# Altium footprint library Package_BGA.PcbLib: 159 footprints (part 8 of 22)
Each footprint in its own frame and in the unit in brackets; x right, y up, seen from the top. Pads: shape width x height; smd on the part's side, far side on the other; paste and mask are expansions set on the pad; w line width, h text height; cw(c..) or ccw(c..) is an arc to the next point about the centre after c.
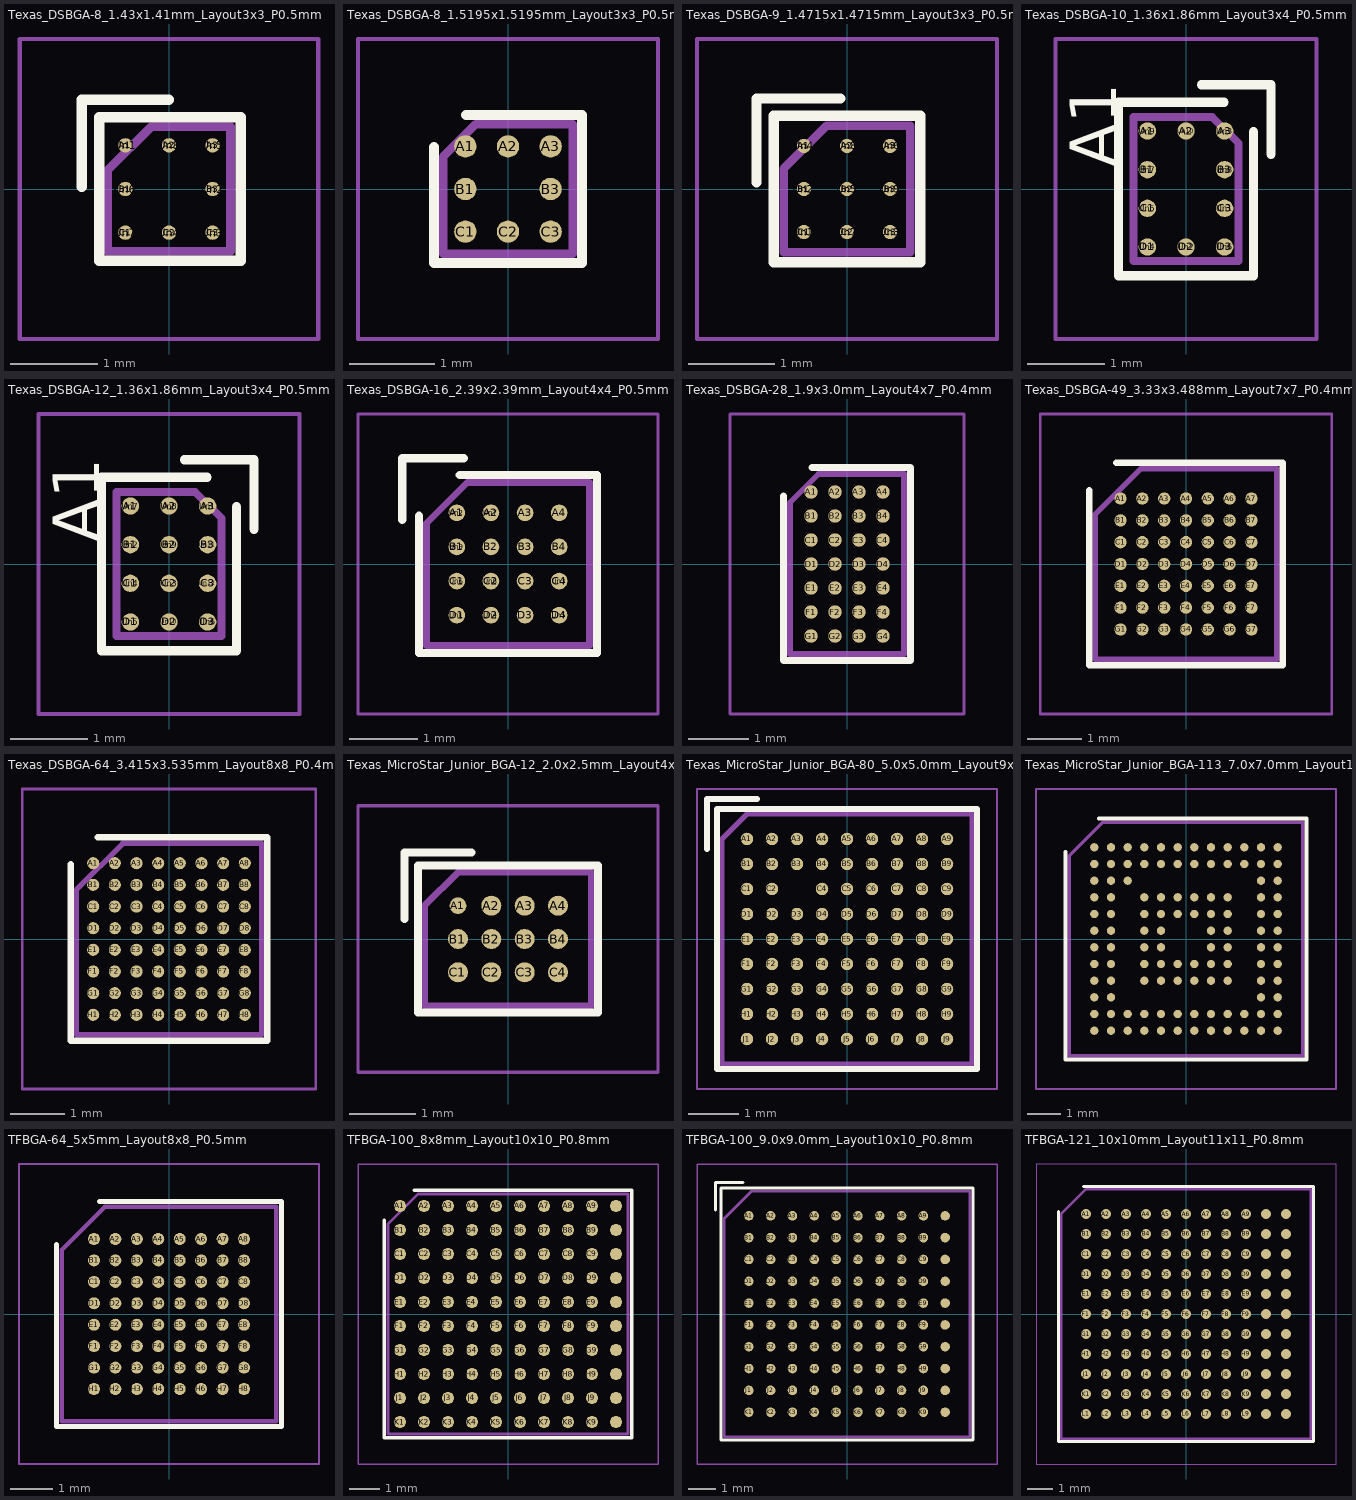
[diagram p7: the footprints below, top view; thin cyan lines are the x and y axes]

## Texas_DSBGA-8_1.43x1.41mm_Layout3x3_P0.5mm [mm]
pads (16):
  round 0.165 smd: A1(-0.5,0.5) A2(0,0.5) A3(0.5,0.5) B1(-0.5,0) B3(0.5,0) C1(-0.5,-0.5) C2(0,-0.5) C3(0.5,-0.5)
  rect 0.3x0.3 on Top Paste: Un1(-0.5,0.5) Un2(0.5,0) Un3(0.5,-0.5) Un4(0,-0.5) Un5(0.5,0.5) Un6(-0.5,0) Un7(-0.5,-0.5) Un8(0,0.5)
F.SilkS:
  lines w0.12: -1,0.025 -1,1.025 0,1.025 ; -0.8,-0.825 0.815,-0.825 ; -0.8,-0.8 -0.8,0.825 ; -0.775,0.825 0.815,0.825 ; 0.825,-0.825 0.825,0.825
F.CrtYd:
  lines w0.05: -1.71,-1.72 -1.71,1.72 1.71,1.72 1.71,-1.72 -1.71,-1.72
F.Fab:
  lines w0.1: -0.705,-0.715 0.705,-0.715 0.705,0.715 -0.205,0.715 -0.705,0.215 -0.705,-0.715
  text "'.Designator'" at -1.209,-0.247 h0.3

## Texas_DSBGA-8_1.5195x1.5195mm_Layout3x3_P0.5mm [mm]
pads (8):
  round 0.262 smd: A1(-0.5,0.5) A2(0,0.5) A3(0.5,0.5) B1(-0.5,0) B3(0.5,0) C1(-0.5,-0.5) C2(0,-0.5) C3(0.5,-0.5)
F.SilkS:
  lines w0.12: -0.87,0.49 -0.87,-0.87 0.87,-0.87 0.87,0.87 -0.49,0.87
F.CrtYd:
  lines w0.05: -1.76,-1.76 1.76,-1.76 1.76,1.76 -1.76,1.76 -1.76,-1.76
F.Fab:
  lines w0.1: -0.76,-0.76 0.76,-0.76 0.76,0.76 -0.38,0.76 -0.76,0.38 -0.76,-0.76
  text "'.Designator'" at -1.416,-0.294 h0.35

## Texas_DSBGA-9_1.4715x1.4715mm_Layout3x3_P0.5mm [mm]
pads (18):
  round 0.165 smd: A1(-0.5,0.5) A2(0,0.5) A3(0.5,0.5) B1(-0.5,0) B2(0,0) B3(0.5,0) C1(-0.5,-0.5) C2(0,-0.5) C3(0.5,-0.5)
  rect 0.3x0.3 on Top Paste: Un1(-0.5,-0.5) Un2(-0.5,0) Un3(0.5,-0.5) Un4(-0.5,0.5) Un5(0,0) Un6(0.5,0.5) Un7(0,-0.5) Un8(0,0.5) Un9(0.5,0)
F.SilkS:
  lines w0.12: -1.05,0.075 -1.05,1.05 -0.075,1.05 ; -0.85,-0.85 0.85,-0.85 0.85,0.85 -0.85,0.85 -0.85,-0.85
F.CrtYd:
  lines w0.05: -1.74,-1.74 -1.74,1.74 1.74,1.74 1.74,-1.74 -1.74,-1.74
F.Fab:
  lines w0.1: -0.736,-0.736 -0.736,0.236 -0.236,0.736 0.736,0.736 0.736,-0.736 -0.736,-0.736
  text "'.Designator'" at -1.209,-0.247 h0.3

## Texas_DSBGA-10_1.36x1.86mm_Layout3x4_P0.5mm [mm]
pads (20):
  round 0.225 smd: A1(-0.5,0.75) A2(0,0.75) A3(0.5,0.75) B1(-0.5,0.25) B3(0.5,0.25) C1(-0.5,-0.25) C3(0.5,-0.25) D1(-0.5,-0.75) D2(0,-0.75) D3(0.5,-0.75)
  rrect20% 0.25x0.25 on Top Paste: Un1(0.5,-0.25) Un2(0,-0.75) Un3(0.5,0.75) Un4(-0.5,-0.75) Un5(-0.5,-0.25) Un6(0.5,-0.75) Un7(-0.5,0.25) Un8(0.5,0.25) Un9(-0.5,0.75) Un10(0,0.75)
F.SilkS:
  lines w0.12: 0.2,1.35 1.1,1.35 1.1,0.45 ; 0.491,1.122 -0.873,1.122 -0.873,-1.122 0.873,-1.122 0.873,0.741
  text "A1" at -0.9,0.28 h0.6
F.CrtYd:
  lines w0.05: -1.69,-1.94 -1.69,1.94 1.69,1.94 1.69,-1.94 -1.69,-1.94
F.Fab:
  lines w0.1: -0.68,-0.93 0.68,-0.93 0.68,0.59 0.34,0.93 -0.68,0.93 -0.68,-0.93
  text "'.Designator'" at -0.361,1.74 h0.43

## Texas_DSBGA-12_1.36x1.86mm_Layout3x4_P0.5mm [mm]
pads (24):
  round 0.225 smd: A1(-0.5,0.75) A2(0,0.75) A3(0.5,0.75) B1(-0.5,0.25) B2(0,0.25) B3(0.5,0.25) C1(-0.5,-0.25) C2(0,-0.25) C3(0.5,-0.25) D1(-0.5,-0.75) D2(0,-0.75) D3(0.5,-0.75)
  rrect20% 0.25x0.25 on Top Paste: Un1(0.5,0.75) Un2(-0.5,0.25) Un3(0,-0.25) Un4(-0.5,-0.25) Un5(-0.5,-0.75) Un6(0.5,-0.75) Un7(-0.5,0.75) Un8(0,0.75) Un9(0,0.25) Un10(0,-0.75) Un11(0.5,0.25) Un12(0.5,-0.25)
F.SilkS:
  lines w0.12: 0.2,1.35 1.1,1.35 1.1,0.45 ; 0.491,1.122 -0.873,1.122 -0.873,-1.122 0.873,-1.122 0.873,0.741
  text "A1" at -0.9,0.28 h0.6
F.CrtYd:
  lines w0.05: -1.69,-1.94 -1.69,1.94 1.69,1.94 1.69,-1.94 -1.69,-1.94
F.Fab:
  lines w0.1: -0.68,-0.93 -0.68,0.93 0.34,0.93 0.68,0.59 0.68,-0.93 -0.68,-0.93
  text "'.Designator'" at -0.361,1.74 h0.43

## Texas_DSBGA-16_2.39x2.39mm_Layout4x4_P0.5mm [mm]
pads (32):
  round 0.245 smd: A1(-0.75,0.75) A2(-0.25,0.75) A3(0.25,0.75) A4(0.75,0.75) B1(-0.75,0.25) B2(-0.25,0.25) B3(0.25,0.25) B4(0.75,0.25) C1(-0.75,-0.25) C2(-0.25,-0.25) C3(0.25,-0.25) C4(0.75,-0.25) D1(-0.75,-0.75) D2(-0.25,-0.75) D3(0.25,-0.75) D4(0.75,-0.75)
  rrect20% 0.25x0.25 on Top Paste: Un1(-0.75,-0.75) Un2(-0.75,0.75) Un3(0.75,-0.25) Un4(-0.25,-0.75) Un5(0.75,-0.75) Un6(-0.75,-0.25) Un7(-0.25,0.75) Un8(-0.25,-0.25) Un9(-0.75,0.25) Un10(0.25,-0.75) Un11(0.75,0.25) Un12(-0.25,0.25) Un13(0.75,0.75) Un14(0.25,0.75) Un15(0.25,-0.25) Un16(0.25,0.25)
F.SilkS:
  lines w0.12: -1.55,0.65 -1.55,1.55 -0.65,1.55 ; -1.305,0.707 -1.305,-1.305 1.305,-1.305 1.305,1.305 -0.707,1.305
F.CrtYd:
  lines w0.05: -2.2,-2.2 -2.2,2.2 2.2,2.2 2.2,-2.2 -2.2,-2.2
F.Fab:
  lines w0.1: -1.195,-1.195 -1.195,0.597 -0.597,1.195 1.195,1.195 1.195,-1.195 -1.195,-1.195
  text "'.Designator'" at -2.266,-0.471 h0.56

## Texas_DSBGA-28_1.9x3.0mm_Layout4x7_P0.4mm [mm]
pads (28):
  round 0.225 smd: A1(-0.6,1.2) A2(-0.2,1.2) A3(0.2,1.2) A4(0.6,1.2) B1(-0.6,0.8) B2(-0.2,0.8) B3(0.2,0.8) B4(0.6,0.8) C1(-0.6,0.4) C2(-0.2,0.4) C3(0.2,0.4) C4(0.6,0.4) D1(-0.6,0) D2(-0.2,0) D3(0.2,0) D4(0.6,0) E1(-0.6,-0.4) E2(-0.2,-0.4) E3(0.2,-0.4) E4(0.6,-0.4) F1(-0.6,-0.8) F2(-0.2,-0.8) F3(0.2,-0.8) F4(0.6,-0.8) G1(-0.6,-1.2) G2(-0.2,-1.2) G3(0.2,-1.2) G4(0.6,-1.2)
F.SilkS:
  lines w0.12: -1.06,1.135 -1.06,-1.61 1.06,-1.61 1.06,1.61 -0.585,1.61
F.CrtYd:
  lines w0.05: -1.95,-2.5 1.95,-2.5 1.95,2.5 -1.95,2.5 -1.95,-2.5
F.Fab:
  lines w0.1: -0.95,-1.5 -0.95,1.025 -0.475,1.5 0.95,1.5 0.95,-1.5 -0.95,-1.5
  text "'.Designator'" at -1.781,-0.37 h0.44

## Texas_DSBGA-49_3.33x3.488mm_Layout7x7_P0.4mm [mm]
pads (49):
  round 0.225 smd: A1(-1.2,1.2) A2(-0.8,1.2) A3(-0.4,1.2) A4(0,1.2) A5(0.4,1.2) A6(0.8,1.2) A7(1.2,1.2) B1(-1.2,0.8) B2(-0.8,0.8) B3(-0.4,0.8) B4(0,0.8) B5(0.4,0.8) B6(0.8,0.8) B7(1.2,0.8) C1(-1.2,0.4) C2(-0.8,0.4) C3(-0.4,0.4) C4(0,0.4) C5(0.4,0.4) C6(0.8,0.4) C7(1.2,0.4) D1(-1.2,0) D2(-0.8,0) D3(-0.4,0) D4(0,0) D5(0.4,0) D6(0.8,0) D7(1.2,0) E1(-1.2,-0.4) E2(-0.8,-0.4) E3(-0.4,-0.4) E4(0,-0.4) E5(0.4,-0.4) E6(0.8,-0.4) E7(1.2,-0.4) F1(-1.2,-0.8) F2(-0.8,-0.8) F3(-0.4,-0.8) F4(0,-0.8) F5(0.4,-0.8) F6(0.8,-0.8) F7(1.2,-0.8) G1(-1.2,-1.2) G2(-0.8,-1.2) G3(-0.4,-1.2) G4(0,-1.2) G5(0.4,-1.2) G6(0.8,-1.2) G7(1.2,-1.2)
F.SilkS:
  lines w0.12: -1.775,1.354 -1.775,-1.854 1.775,-1.854 1.775,1.854 -1.275,1.854
F.CrtYd:
  lines w0.05: -2.67,-2.75 -2.67,2.75 2.67,2.75 2.67,-2.75 -2.67,-2.75
F.Fab:
  lines w0.1: -1.665,-1.744 1.665,-1.744 1.665,1.744 -0.833,1.744 -1.665,0.911 -1.665,-1.744
  text "'.Designator'" at -3.247,-0.682 h0.8

## Texas_DSBGA-64_3.415x3.535mm_Layout8x8_P0.4mm [mm]
pads (64):
  round 0.225 smd: A1(-1.4,1.4) A2(-1,1.4) A3(-0.6,1.4) A4(-0.2,1.4) A5(0.2,1.4) A6(0.6,1.4) A7(1,1.4) A8(1.4,1.4) B1(-1.4,1) B2(-1,1) B3(-0.6,1) B4(-0.2,1) B5(0.2,1) B6(0.6,1) B7(1,1) B8(1.4,1) C1(-1.4,0.6) C2(-1,0.6) C3(-0.6,0.6) C4(-0.2,0.6) C5(0.2,0.6) C6(0.6,0.6) C7(1,0.6) C8(1.4,0.6) D1(-1.4,0.2) D2(-1,0.2) D3(-0.6,0.2) D4(-0.2,0.2) D5(0.2,0.2) D6(0.6,0.2) D7(1,0.2) D8(1.4,0.2) E1(-1.4,-0.2) E2(-1,-0.2) E3(-0.6,-0.2) E4(-0.2,-0.2) E5(0.2,-0.2) E6(0.6,-0.2) E7(1,-0.2) E8(1.4,-0.2) F1(-1.4,-0.6) F2(-1,-0.6) F3(-0.6,-0.6) F4(-0.2,-0.6) F5(0.2,-0.6) F6(0.6,-0.6) F7(1,-0.6) F8(1.4,-0.6) G1(-1.4,-1) G2(-1,-1) G3(-0.6,-1) G4(-0.2,-1) G5(0.2,-1) G6(0.6,-1) G7(1,-1) G8(1.4,-1) H1(-1.4,-1.4) H2(-1,-1.4) H3(-0.6,-1.4) H4(-0.2,-1.4) H5(0.2,-1.4) H6(0.6,-1.4) H7(1,-1.4) H8(1.4,-1.4)
F.SilkS:
  lines w0.12: -1.817,1.378 -1.817,-1.877 1.817,-1.877 1.817,1.877 -1.318,1.877
F.CrtYd:
  lines w0.05: -2.71,-2.77 -2.71,2.77 2.71,2.77 2.71,-2.77 -2.71,-2.77
F.Fab:
  lines w0.1: -1.707,-1.767 -1.707,0.914 -0.854,1.767 1.707,1.767 1.707,-1.767 -1.707,-1.767
  text "'.Designator'" at -3.247,-0.682 h0.8

## Texas_MicroStar_Junior_BGA-12_2.0x2.5mm_Layout4x3_P0.5mm [mm]
pads (12):
  round 0.25 smd: A1(-0.75,0.5)
  round 0.3 smd: A2(-0.25,0.5) A3(0.25,0.5) A4(0.75,0.5) B1(-0.75,0) B2(-0.25,0) B3(0.25,0) B4(0.75,0) C1(-0.75,-0.5) C2(-0.25,-0.5) C3(0.25,-0.5) C4(0.75,-0.5)
F.SilkS:
  lines w0.12: -1.55,0.3 -1.55,1.3 -0.55,1.3 ; -1.35,-1.1 1.35,-1.1 1.35,1.1 -1.35,1.1 -1.35,-1.1
F.CrtYd:
  lines w0.05: -2.25,-2 2.25,-2 2.25,2 -2.25,2 -2.25,-2
F.Fab:
  lines w0.1: -1.25,-1 -1.25,0.5 -0.75,1 1.25,1 1.25,-1 -1.25,-1
  text "'.Designator'" at -2.398,-0.474 h0.6

## Texas_MicroStar_Junior_BGA-80_5.0x5.0mm_Layout9x9_P0.5mm [mm]
pads (80):
  round 0.25 smd: A1(-2,2) A2(-1.5,2) A3(-1,2) A4(-0.5,2) A5(0,2) A6(0.5,2) A7(1,2) A8(1.5,2) A9(2,2) B1(-2,1.5) B2(-1.5,1.5) B3(-1,1.5) B4(-0.5,1.5) B5(0,1.5) B6(0.5,1.5) B7(1,1.5) B8(1.5,1.5) B9(2,1.5) C1(-2,1) C2(-1.5,1) C4(-0.5,1) C5(0,1) C6(0.5,1) C7(1,1) C8(1.5,1) C9(2,1) D1(-2,0.5) D2(-1.5,0.5) D3(-1,0.5) D4(-0.5,0.5) D5(0,0.5) D6(0.5,0.5) D7(1,0.5) D8(1.5,0.5) D9(2,0.5) E1(-2,0) E2(-1.5,0) E3(-1,0) E4(-0.5,0) E5(0,0) E6(0.5,0) E7(1,0) E8(1.5,0) E9(2,0) F1(-2,-0.5) F2(-1.5,-0.5) F3(-1,-0.5) F4(-0.5,-0.5) F5(0,-0.5) F6(0.5,-0.5) F7(1,-0.5) F8(1.5,-0.5) F9(2,-0.5) G1(-2,-1) G2(-1.5,-1) G3(-1,-1) G4(-0.5,-1) G5(0,-1) G6(0.5,-1) G7(1,-1) G8(1.5,-1) G9(2,-1) H1(-2,-1.5) H2(-1.5,-1.5) H3(-1,-1.5) H4(-0.5,-1.5) H5(0,-1.5) H6(0.5,-1.5) H7(1,-1.5) H8(1.5,-1.5) H9(2,-1.5) J1(-2,-2) J2(-1.5,-2) J3(-1,-2) J4(-0.5,-2) J5(0,-2) J6(0.5,-2) J7(1,-2) J8(1.5,-2) J9(2,-2)
F.SilkS:
  lines w0.12: -2.8,1.8 -2.8,2.8 -1.8,2.8 ; -2.6,-2.6 2.6,-2.6 2.6,2.6 -2.6,2.6 -2.6,-2.6
F.CrtYd:
  lines w0.05: -3,-3 3,-3 3,3 -3,3 -3,-3
F.Fab:
  lines w0.1: -2.5,-2.5 2.5,-2.5 2.5,2.5 -2,2.5 -2.5,2 -2.5,-2.5
  text "'.Designator'" at -4.047,-0.84 h1

## Texas_MicroStar_Junior_BGA-113_7.0x7.0mm_Layout12x12_P0.5mm [mm]
pads (113):
  round 0.25 smd: A1(-2.75,2.75) A2(-2.25,2.75) A3(-1.75,2.75) A4(-1.25,2.75) A5(-0.75,2.75) A6(-0.25,2.75) A7(0.25,2.75) A8(0.75,2.75) A9(1.25,2.75) A10(1.75,2.75) A11(2.25,2.75) A12(2.75,2.75) B1(-2.75,2.25) B2(-2.25,2.25) B3(-1.75,2.25) B4(-1.25,2.25) B5(-0.75,2.25) B6(-0.25,2.25) B7(0.25,2.25) B8(0.75,2.25) B9(1.25,2.25) B10(1.75,2.25) B11(2.25,2.25) B12(2.75,2.25) C1(-2.75,1.75) C2(-2.25,1.75) C3(-1.75,1.75) C11(2.25,1.75) C12(2.75,1.75) D1(-2.75,1.25) D2(-2.25,1.25) D4(-1.25,1.25) D5(-0.75,1.25) D6(-0.25,1.25) D7(0.25,1.25) D8(0.75,1.25) D9(1.25,1.25) D11(2.25,1.25) D12(2.75,1.25) E1(-2.75,0.75) E2(-2.25,0.75) E4(-1.25,0.75) E5(-0.75,0.75) E6(-0.25,0.75) E7(0.25,0.75) E8(0.75,0.75) E9(1.25,0.75) E11(2.25,0.75) E12(2.75,0.75) F1(-2.75,0.25) F2(-2.25,0.25) F4(-1.25,0.25) F5(-0.75,0.25) F8(0.75,0.25) F9(1.25,0.25) F11(2.25,0.25) F12(2.75,0.25) G1(-2.75,-0.25) G2(-2.25,-0.25) G4(-1.25,-0.25) G5(-0.75,-0.25) G8(0.75,-0.25) G9(1.25,-0.25) G11(2.25,-0.25) G12(2.75,-0.25) H1(-2.75,-0.75) H2(-2.25,-0.75) H4(-1.25,-0.75) H5(-0.75,-0.75) H6(-0.25,-0.75) H7(0.25,-0.75) H8(0.75,-0.75) H9(1.25,-0.75) H11(2.25,-0.75) H12(2.75,-0.75) I1(-2.75,-1.25) I2(-2.25,-1.25) I4(-1.25,-1.25) I5(-0.75,-1.25) I6(-0.25,-1.25) I7(0.25,-1.25) I8(0.75,-1.25) I9(1.25,-1.25) I11(2.25,-1.25) I12(2.75,-1.25) J1(-2.75,-1.75) J2(-2.25,-1.75) J11(2.25,-1.75) J12(2.75,-1.75) K1(-2.75,-2.25) K2(-2.25,-2.25) K3(-1.75,-2.25) K4(-1.25,-2.25) K5(-0.75,-2.25) K6(-0.25,-2.25) K7(0.25,-2.25) K8(0.75,-2.25) K9(1.25,-2.25) K10(1.75,-2.25) K11(2.25,-2.25) K12(2.75,-2.25) L1(-2.75,-2.75) L2(-2.25,-2.75) L3(-1.75,-2.75) L4(-1.25,-2.75) L5(-0.75,-2.75) L6(-0.25,-2.75) L7(0.25,-2.75) L8(0.75,-2.75) L9(1.25,-2.75) L10(1.75,-2.75) L11(2.25,-2.75) L12(2.75,-2.75)
F.SilkS:
  lines w0.12: -3.61,2.61 -3.61,-3.61 3.61,-3.61 3.61,3.61 -2.61,3.61
F.CrtYd:
  lines w0.05: -4.5,-4.5 -4.5,4.5 4.5,4.5 4.5,-4.5 -4.5,-4.5
F.Fab:
  lines w0.1: -3.5,-3.5 3.5,-3.5 3.5,3.5 -2.5,3.5 -3.5,2.5 -3.5,-3.5
  text "'.Designator'" at -4.047,-0.84 h1

## TFBGA-64_5x5mm_Layout8x8_P0.5mm [mm]
pads (64):
  round 0.28 smd: A1(-1.75,1.75) A2(-1.25,1.75) A3(-0.75,1.75) A4(-0.25,1.75) A5(0.25,1.75) A6(0.75,1.75) A7(1.25,1.75) A8(1.75,1.75) B1(-1.75,1.25) B2(-1.25,1.25) B3(-0.75,1.25) B4(-0.25,1.25) B5(0.25,1.25) B6(0.75,1.25) B7(1.25,1.25) B8(1.75,1.25) C1(-1.75,0.75) C2(-1.25,0.75) C3(-0.75,0.75) C4(-0.25,0.75) C5(0.25,0.75) C6(0.75,0.75) C7(1.25,0.75) C8(1.75,0.75) D1(-1.75,0.25) D2(-1.25,0.25) D3(-0.75,0.25) D4(-0.25,0.25) D5(0.25,0.25) D6(0.75,0.25) D7(1.25,0.25) D8(1.75,0.25) E1(-1.75,-0.25) E2(-1.25,-0.25) E3(-0.75,-0.25) E4(-0.25,-0.25) E5(0.25,-0.25) E6(0.75,-0.25) E7(1.25,-0.25) E8(1.75,-0.25) F1(-1.75,-0.75) F2(-1.25,-0.75) F3(-0.75,-0.75) F4(-0.25,-0.75) F5(0.25,-0.75) F6(0.75,-0.75) F7(1.25,-0.75) F8(1.75,-0.75) G1(-1.75,-1.25) G2(-1.25,-1.25) G3(-0.75,-1.25) G4(-0.25,-1.25) G5(0.25,-1.25) G6(0.75,-1.25) G7(1.25,-1.25) G8(1.75,-1.25) H1(-1.75,-1.75) H2(-1.25,-1.75) H3(-0.75,-1.75) H4(-0.25,-1.75) H5(0.25,-1.75) H6(0.75,-1.75) H7(1.25,-1.75) H8(1.75,-1.75)
F.SilkS:
  lines w0.12: -2.625,1.625 -2.625,-2.625 2.625,-2.625 2.625,2.625 -1.625,2.625
F.CrtYd:
  lines w0.05: -3.5,-3.5 3.5,-3.5 3.5,3.5 -3.5,3.5 -3.5,-3.5
F.Fab:
  lines w0.1: -2.5,-2.5 -2.5,1.5 -1.5,2.5 2.5,2.5 2.5,-2.5 -2.5,-2.5
  text "'.Designator'" at -4.047,-0.84 h1

## TFBGA-100_8x8mm_Layout10x10_P0.8mm [mm]
pads (100):
  round 0.4 smd: A1(-3.6,3.6) A2(-2.8,3.6) A3(-2,3.6) A4(-1.2,3.6) A5(-0.4,3.6) A6(0.4,3.6) A7(1.2,3.6) A8(2,3.6) A9(2.8,3.6) A10(3.6,3.6) B1(-3.6,2.8) B2(-2.8,2.8) B3(-2,2.8) B4(-1.2,2.8) B5(-0.4,2.8) B6(0.4,2.8) B7(1.2,2.8) B8(2,2.8) B9(2.8,2.8) B10(3.6,2.8) C1(-3.6,2) C2(-2.8,2) C3(-2,2) C4(-1.2,2) C5(-0.4,2) C6(0.4,2) C7(1.2,2) C8(2,2) C9(2.8,2) C10(3.6,2) D1(-3.6,1.2) D2(-2.8,1.2) D3(-2,1.2) D4(-1.2,1.2) D5(-0.4,1.2) D6(0.4,1.2) D7(1.2,1.2) D8(2,1.2) D9(2.8,1.2) D10(3.6,1.2) E1(-3.6,0.4) E2(-2.8,0.4) E3(-2,0.4) E4(-1.2,0.4) E5(-0.4,0.4) E6(0.4,0.4) E7(1.2,0.4) E8(2,0.4) E9(2.8,0.4) E10(3.6,0.4) F1(-3.6,-0.4) F2(-2.8,-0.4) F3(-2,-0.4) F4(-1.2,-0.4) F5(-0.4,-0.4) F6(0.4,-0.4) F7(1.2,-0.4) F8(2,-0.4) F9(2.8,-0.4) F10(3.6,-0.4) G1(-3.6,-1.2) G2(-2.8,-1.2) G3(-2,-1.2) G4(-1.2,-1.2) G5(-0.4,-1.2) G6(0.4,-1.2) G7(1.2,-1.2) G8(2,-1.2) G9(2.8,-1.2) G10(3.6,-1.2) H1(-3.6,-2) H2(-2.8,-2) H3(-2,-2) H4(-1.2,-2) H5(-0.4,-2) H6(0.4,-2) H7(1.2,-2) H8(2,-2) H9(2.8,-2) H10(3.6,-2) J1(-3.6,-2.8) J2(-2.8,-2.8) J3(-2,-2.8) J4(-1.2,-2.8) J5(-0.4,-2.8) J6(0.4,-2.8) J7(1.2,-2.8) J8(2,-2.8) J9(2.8,-2.8) J10(3.6,-2.8) K1(-3.6,-3.6) K2(-2.8,-3.6) K3(-2,-3.6) K4(-1.2,-3.6) K5(-0.4,-3.6) K6(0.4,-3.6) K7(1.2,-3.6) K8(2,-3.6) K9(2.8,-3.6) K10(3.6,-3.6)
F.SilkS:
  lines w0.12: -4.125,3.125 -4.125,-4.125 4.125,-4.125 4.125,4.125 -3.125,4.125
F.CrtYd:
  lines w0.05: -5,-5 -5,5 5,5 5,-5 -5,-5
F.Fab:
  lines w0.1: -4,-4 4,-4 4,4 -3,4 -4,3 -4,-4
  text "'.Designator'" at -4.047,-0.84 h1

## TFBGA-100_9.0x9.0mm_Layout10x10_P0.8mm [mm]
pads (100):
  round 0.35 smd: A1(-3.6,3.6) A2(-2.8,3.6) A3(-2,3.6) A4(-1.2,3.6) A5(-0.4,3.6) A6(0.4,3.6) A7(1.2,3.6) A8(2,3.6) A9(2.8,3.6) A10(3.6,3.6) B1(-3.6,2.8) B2(-2.8,2.8) B3(-2,2.8) B4(-1.2,2.8) B5(-0.4,2.8) B6(0.4,2.8) B7(1.2,2.8) B8(2,2.8) B9(2.8,2.8) B10(3.6,2.8) C1(-3.6,2) C2(-2.8,2) C3(-2,2) C4(-1.2,2) C5(-0.4,2) C6(0.4,2) C7(1.2,2) C8(2,2) C9(2.8,2) C10(3.6,2) D1(-3.6,1.2) D2(-2.8,1.2) D3(-2,1.2) D4(-1.2,1.2) D5(-0.4,1.2) D6(0.4,1.2) D7(1.2,1.2) D8(2,1.2) D9(2.8,1.2) D10(3.6,1.2) E1(-3.6,0.4) E2(-2.8,0.4) E3(-2,0.4) E4(-1.2,0.4) E5(-0.4,0.4) E6(0.4,0.4) E7(1.2,0.4) E8(2,0.4) E9(2.8,0.4) E10(3.6,0.4) F1(-3.6,-0.4) F2(-2.8,-0.4) F3(-2,-0.4) F4(-1.2,-0.4) F5(-0.4,-0.4) F6(0.4,-0.4) F7(1.2,-0.4) F8(2,-0.4) F9(2.8,-0.4) F10(3.6,-0.4) G1(-3.6,-1.2) G2(-2.8,-1.2) G3(-2,-1.2) G4(-1.2,-1.2) G5(-0.4,-1.2) G6(0.4,-1.2) G7(1.2,-1.2) G8(2,-1.2) G9(2.8,-1.2) G10(3.6,-1.2) H1(-3.6,-2) H2(-2.8,-2) H3(-2,-2) H4(-1.2,-2) H5(-0.4,-2) H6(0.4,-2) H7(1.2,-2) H8(2,-2) H9(2.8,-2) H10(3.6,-2) J1(-3.6,-2.8) J2(-2.8,-2.8) J3(-2,-2.8) J4(-1.2,-2.8) J5(-0.4,-2.8) J6(0.4,-2.8) J7(1.2,-2.8) J8(2,-2.8) J9(2.8,-2.8) J10(3.6,-2.8) K1(-3.6,-3.6) K2(-2.8,-3.6) K3(-2,-3.6) K4(-1.2,-3.6) K5(-0.4,-3.6) K6(0.4,-3.6) K7(1.2,-3.6) K8(2,-3.6) K9(2.8,-3.6) K10(3.6,-3.6)
F.SilkS:
  lines w0.12: -4.82,3.82 -4.82,4.82 -3.82,4.82 ; -4.62,-4.62 -4.62,4.62 4.62,4.62 4.62,-4.62 -4.62,-4.62
F.CrtYd:
  lines w0.05: -5.5,-5.5 5.5,-5.5 5.5,5.5 -5.5,5.5 -5.5,-5.5
F.Fab:
  lines w0.1: -4.5,-4.5 4.5,-4.5 4.5,4.5 -3.5,4.5 -4.5,3.5 -4.5,-4.5
  text "'.Designator'" at -4.047,-0.84 h1

## TFBGA-121_10x10mm_Layout11x11_P0.8mm [mm]
pads (121):
  round 0.4 smd: A1(-4,4) A2(-3.2,4) A3(-2.4,4) A4(-1.6,4) A5(-0.8,4) A6(0,4) A7(0.8,4) A8(1.6,4) A9(2.4,4) A10(3.2,4) A11(4,4) B1(-4,3.2) B2(-3.2,3.2) B3(-2.4,3.2) B4(-1.6,3.2) B5(-0.8,3.2) B6(0,3.2) B7(0.8,3.2) B8(1.6,3.2) B9(2.4,3.2) B10(3.2,3.2) B11(4,3.2) C1(-4,2.4) C2(-3.2,2.4) C3(-2.4,2.4) C4(-1.6,2.4) C5(-0.8,2.4) C6(0,2.4) C7(0.8,2.4) C8(1.6,2.4) C9(2.4,2.4) C10(3.2,2.4) C11(4,2.4) D1(-4,1.6) D2(-3.2,1.6) D3(-2.4,1.6) D4(-1.6,1.6) D5(-0.8,1.6) D6(0,1.6) D7(0.8,1.6) D8(1.6,1.6) D9(2.4,1.6) D10(3.2,1.6) D11(4,1.6) E1(-4,0.8) E2(-3.2,0.8) E3(-2.4,0.8) E4(-1.6,0.8) E5(-0.8,0.8) E6(0,0.8) E7(0.8,0.8) E8(1.6,0.8) E9(2.4,0.8) E10(3.2,0.8) E11(4,0.8) F1(-4,0) F2(-3.2,0) F3(-2.4,0) F4(-1.6,0) F5(-0.8,0) F6(0,0) F7(0.8,0) F8(1.6,0) F9(2.4,0) F10(3.2,0) F11(4,0) G1(-4,-0.8) G2(-3.2,-0.8) G3(-2.4,-0.8) G4(-1.6,-0.8) G5(-0.8,-0.8) G6(0,-0.8) G7(0.8,-0.8) G8(1.6,-0.8) G9(2.4,-0.8) G10(3.2,-0.8) G11(4,-0.8) H1(-4,-1.6) H2(-3.2,-1.6) H3(-2.4,-1.6) H4(-1.6,-1.6) H5(-0.8,-1.6) H6(0,-1.6) H7(0.8,-1.6) H8(1.6,-1.6) H9(2.4,-1.6) H10(3.2,-1.6) H11(4,-1.6) J1(-4,-2.4) J2(-3.2,-2.4) J3(-2.4,-2.4) J4(-1.6,-2.4) J5(-0.8,-2.4) J6(0,-2.4) J7(0.8,-2.4) J8(1.6,-2.4) J9(2.4,-2.4) J10(3.2,-2.4) J11(4,-2.4) K1(-4,-3.2) K2(-3.2,-3.2) K3(-2.4,-3.2) K4(-1.6,-3.2) K5(-0.8,-3.2) K6(0,-3.2) K7(0.8,-3.2) K8(1.6,-3.2) K9(2.4,-3.2) K10(3.2,-3.2) K11(4,-3.2) L1(-4,-4) L2(-3.2,-4) L3(-2.4,-4) L4(-1.6,-4) L5(-0.8,-4) L6(0,-4) L7(0.8,-4) L8(1.6,-4) L9(2.4,-4) L10(3.2,-4) L11(4,-4)
F.SilkS:
  lines w0.12: -5.11,4.11 -5.11,-5.11 5.11,-5.11 5.11,5.11 -4.11,5.11
F.CrtYd:
  lines w0.05: -6,-6 -6,6 6,6 6,-6 -6,-6
F.Fab:
  lines w0.1: -5,-5 5,-5 5,5 -4,5 -5,4 -5,-5
  text "'.Designator'" at -4.047,-0.84 h1